# Altium footprint library PCBLIB.PcbLib: 557 footprints (part 32 of 36)
Each footprint in its own frame and in the unit in brackets; x right, y up, seen from the top. Pads: shape width x height; smd on the part's side, far side on the other; paste and mask are expansions set on the pad; w line width, h text height; cw(c..) or ccw(c..) is an arc to the next point about the centre after c.
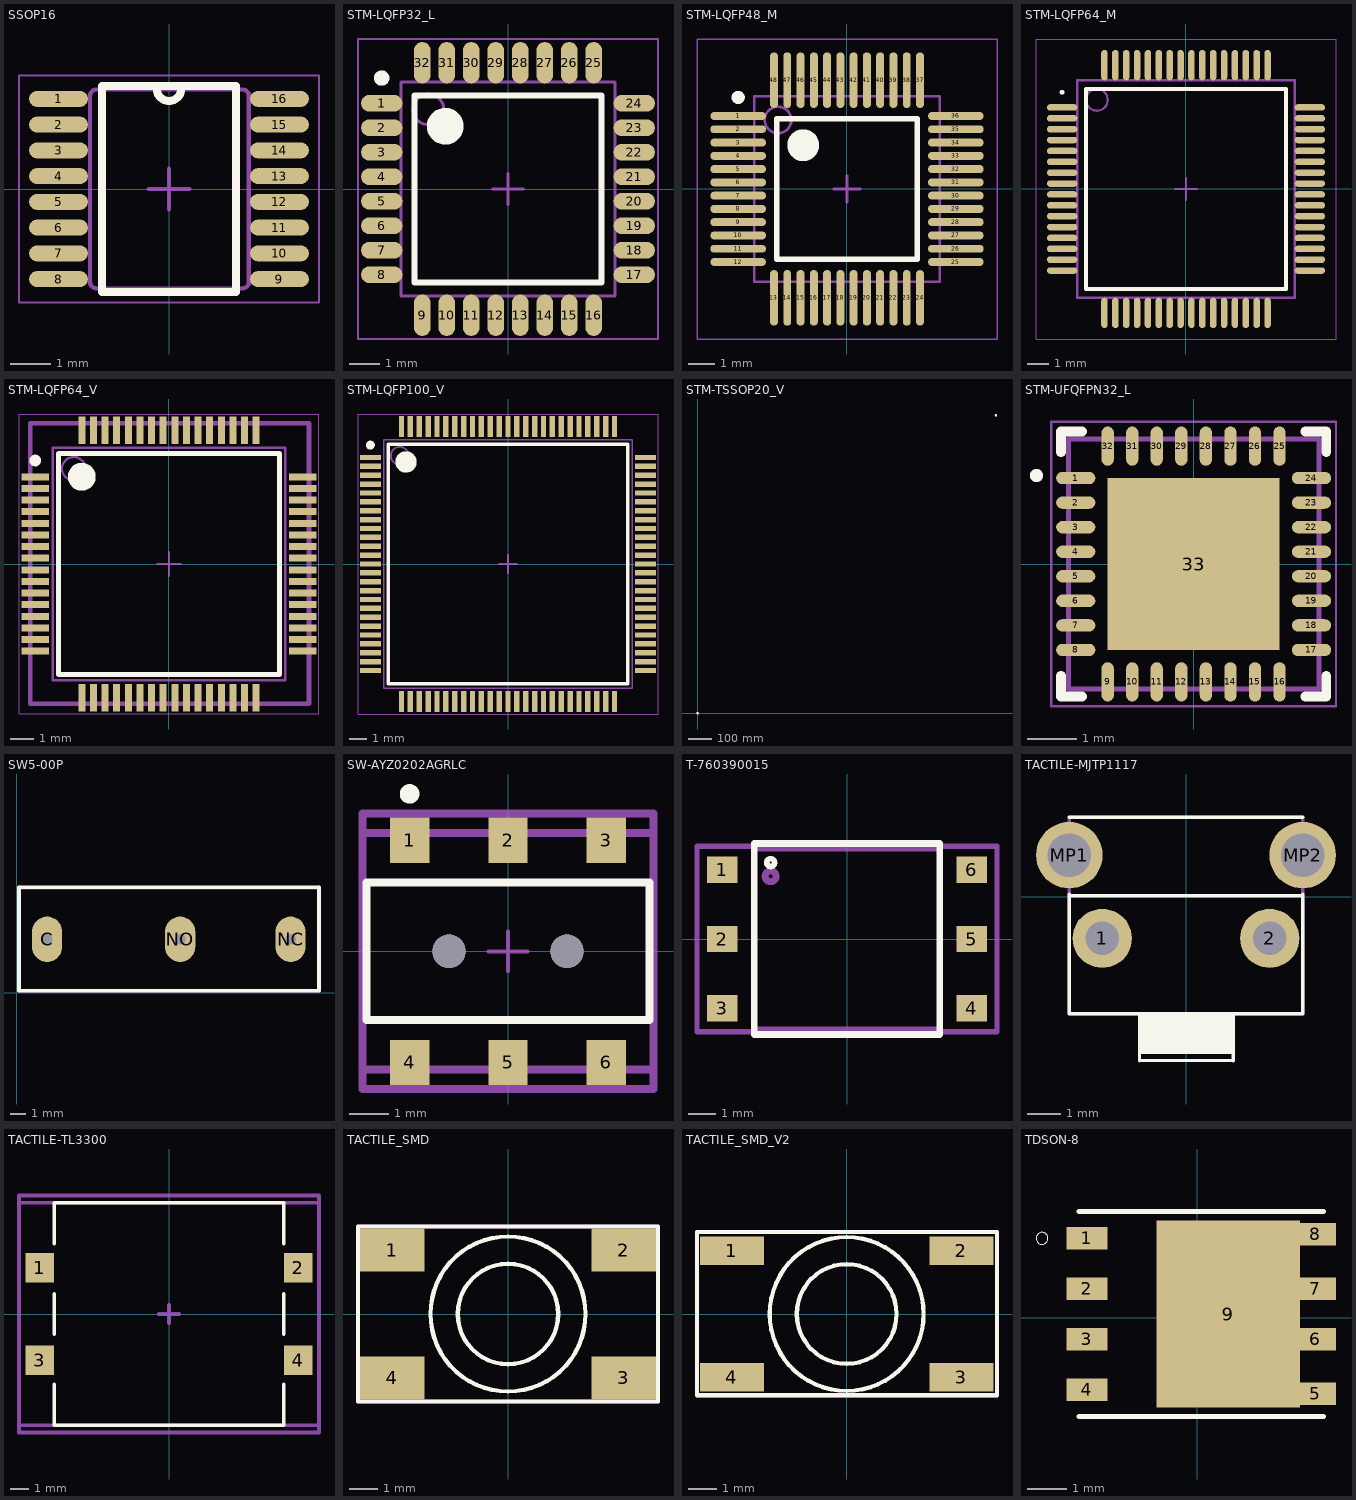
[diagram p31: the footprints below, top view; thin cyan lines are the x and y axes]

## SSOP16 [mm]
height 1.25
pads (16):
  oval 1.45x0.4 smd paste+0 mask+0.05: 1(-2.725,2.222) 2(-2.725,1.587) 3(-2.725,0.953) 4(-2.725,0.318) 5(-2.725,-0.318) 6(-2.725,-0.953) 7(-2.725,-1.587) 8(-2.725,-2.222) 9(2.725,-2.222) 10(2.725,-1.587) 11(2.725,-0.953) 12(2.725,-0.318) 13(2.725,0.318) 14(2.725,0.953) 15(2.725,1.587) 16(2.725,2.222)
Top Overlay:
  lines w0.2: -0.305,2.476 ccw(c0,2.476) 0.305,2.476 ; -1.651,-2.54 1.651,-2.54 1.651,2.54 -1.651,2.54 -1.651,-2.54
Mechanical 15:
  lines w0.05: -3.7,-2.8 3.7,-2.8 3.7,2.8 -3.7,2.8 -3.7,-2.8
  lines w0.1: -0.5,0 0.5,0 ; 0,-0.5 0,0.5
ASM Top:
  lines w0.1: -1.944,-2.349 -1.944,-2.095 ; -1.944,-1.714 -1.944,-1.46 ; -1.944,-1.079 -1.944,-0.825 ; -1.944,-0.444 -1.944,-0.19 ; -1.944,0.191 -1.944,0.445 ; -1.944,0.826 -1.944,1.08 ; -1.944,1.461 -1.944,1.715 ; -1.944,2.096 -1.944,2.35 ; 1.967,-2.349 1.967,-2.095 ; 1.967,-1.714 1.967,-1.46 ; 1.967,-1.079 1.967,-0.825 ; 1.967,-0.444 1.967,-0.19 ; 1.967,0.191 1.967,0.445 ; 1.967,0.826 1.967,1.08 ; 1.967,1.461 1.967,1.715 ; 1.967,2.096 1.967,2.35 ; -1.944,-2.3 ccw(c-1.795,-2.301) -1.794,-2.451 -1.792,-2.451 1.815,-2.451 1.817,-2.451 ccw(c1.818,-2.301) 1.967,-2.3 1.967,-2.298 1.967,2.299 1.967,2.302 ccw(c1.818,2.303) 1.817,2.452 1.815,2.452 -1.792,2.452 -1.794,2.452 ccw(c-1.795,2.303) -1.944,2.302 -1.944,2.299 -1.944,-2.298 -1.944,-2.3
  text ".designator" at -0.6,-0.2 h0.8
3D body "SSOP16.step": height 1.75, standoff 0.01, extent -3.126,-2.5 3.127,2.5

## STM-LQFP32_L [mm] "QFP, 32-Leads, Body 7x7mm, Pitch 0.8mm, IPC High Density"
height 1.6
pads (32):
  oval 1.35x0.55 smd mask+0.05: 1(-4.125,2.8) 2(-4.125,2) 3(-4.125,1.2) 4(-4.125,0.4) 5(-4.125,-0.4) 6(-4.125,-1.2) 7(-4.125,-2) 8(-4.125,-2.8) 17(4.125,-2.8) 18(4.125,-2) 19(4.125,-1.2) 20(4.125,-0.4) 21(4.125,0.4) 22(4.125,1.2) 23(4.125,2) 24(4.125,2.8)
  oval 0.55x1.35 smd mask+0.05: 9(-2.8,-4.125) 10(-2,-4.125) 11(-1.2,-4.125) 12(-0.4,-4.125) 13(0.4,-4.125) 14(1.2,-4.125) 15(2,-4.125) 16(2.8,-4.125) 25(2.8,4.125) 26(2,4.125) 27(1.2,4.125) 28(0.4,4.125) 29(-0.4,4.125) 30(-1.2,4.125) 31(-2,4.125) 32(-2.8,4.125)
Top Overlay:
  circle w0.25: c-4.125,3.625 r0.125
  circle w0.6: c-2.05,2.05 r0.3
  lines w0.2: -3.05,-3.05 -3.05,3.05 3.05,3.05 3.05,-3.05 -3.05,-3.05
Mechanical 15:
  lines w0.05: -4.9,-4.9 -4.9,4.9 4.9,4.9 4.9,-4.9 -4.9,-4.9
  lines w0.1: -0.5,0 0.5,0 ; 0,-0.5 0,0.5
ASM Top:
  circle w0.1: c-2.6,2.599 r0.5
  lines w0.1: -3.5,-3.501 3.5,-3.501 3.5,3.499 -3.5,3.499 -3.5,-3.501
3D body "User Library-LQFP32-2.STEP": height 1.64, standoff 0.01, extent -4.571,-4.572 4.573,4.572

## STM-LQFP48_M [mm] "QFP, 48-Leads, Body 7x7mm, Pitch 0.5mm, IPC Low Density"
height 1.6
pads (48):
  oval 2.1x0.3 smd mask+0.05: 1(-4.1,2.75) 2(-4.1,2.25) 3(-4.1,1.75) 4(-4.1,1.25) 5(-4.1,0.75) 6(-4.1,0.25) 7(-4.1,-0.25) 8(-4.1,-0.75) 9(-4.1,-1.25) 10(-4.1,-1.75) 11(-4.1,-2.25) 12(-4.1,-2.75) 25(4.1,-2.75) 26(4.1,-2.25) 27(4.1,-1.75) 28(4.1,-1.25) 29(4.1,-0.75) 30(4.1,-0.25) 31(4.1,0.25) 32(4.1,0.75) 33(4.1,1.25) 34(4.1,1.75) 35(4.1,2.25) 36(4.1,2.75)
  oval 0.3x2.1 smd mask+0.05: 13(-2.75,-4.1) 14(-2.25,-4.1) 15(-1.75,-4.1) 16(-1.25,-4.1) 17(-0.75,-4.1) 18(-0.25,-4.1) 19(0.25,-4.1) 20(0.75,-4.1) 21(1.25,-4.1) 22(1.75,-4.1) 23(2.25,-4.1) 24(2.75,-4.1) 37(2.75,4.1) 38(2.25,4.1) 39(1.75,4.1) 40(1.25,4.1) 41(0.75,4.1) 42(0.25,4.1) 43(-0.25,4.1) 44(-0.75,4.1) 45(-1.25,4.1) 46(-1.75,4.1) 47(-2.25,4.1) 48(-2.75,4.1)
Top Overlay:
  circle w0.25: c-4.1,3.45 r0.125
  circle w0.6: c-1.65,1.65 r0.3
  lines w0.2: -2.65,-2.65 -2.65,2.65 2.65,2.65 2.65,-2.65 -2.65,-2.65
Mechanical 15:
  lines w0.05: -5.65,-5.65 -5.65,5.65 5.65,5.65 5.65,-5.65 -5.65,-5.65
  lines w0.1: -0.5,0 0.5,0 ; 0,-0.5 0,0.5
ASM Top:
  circle w0.1: c-2.6,2.6 r0.5
  lines w0.1: -3.5,-3.5 3.5,-3.5 3.5,3.5 -3.5,3.5 -3.5,-3.5
3D body "SW3dPS-Quad50M48.STEP": height 1.57, standoff 0.01, extent -4.5,-4.436 4.5,4.564

## STM-LQFP64_M [mm] "QFP, 64-Leads, Body 10x10mm, Pitch 0.5mm, IPC Low Density"
height 1.6
pads (64):
  oval 1.4x0.3 smd: 1(-5.7,3.75) 2(-5.7,3.25) 3(-5.7,2.75) 4(-5.7,2.25) 5(-5.7,1.75) 6(-5.7,1.25) 7(-5.7,0.75) 8(-5.7,0.25) 9(-5.7,-0.25) 10(-5.7,-0.75) 11(-5.7,-1.25) 12(-5.7,-1.75) 13(-5.7,-2.25) 14(-5.7,-2.75) 15(-5.7,-3.25) 16(-5.7,-3.75) 33(5.7,-3.75) 34(5.7,-3.25) 35(5.7,-2.75) 36(5.7,-2.25) 37(5.7,-1.75) 38(5.7,-1.25) 39(5.7,-0.75) 40(5.7,-0.25) 41(5.7,0.25) 42(5.7,0.75) 43(5.7,1.25) 44(5.7,1.75) 45(5.7,2.25) 46(5.7,2.75) 47(5.7,3.25) 48(5.7,3.75)
  oval 0.3x1.4 smd: 17(-3.75,-5.7) 18(-3.25,-5.7) 19(-2.75,-5.7) 20(-2.25,-5.7) 21(-1.75,-5.7) 22(-1.25,-5.7) 23(-0.75,-5.7) 24(-0.25,-5.7) 25(0.25,-5.7) 26(0.75,-5.7) 27(1.25,-5.7) 28(1.75,-5.7) 29(2.25,-5.7) 30(2.75,-5.7) 31(3.25,-5.7) 32(3.75,-5.7) 49(3.75,5.7) 50(3.25,5.7) 51(2.75,5.7) 52(2.25,5.7) 53(1.75,5.7) 54(1.25,5.7) 55(0.75,5.7) 56(0.25,5.7) 57(-0.25,5.7) 58(-0.75,5.7) 59(-1.25,5.7) 60(-1.75,5.7) 61(-2.25,5.7) 62(-2.75,5.7) 63(-3.25,5.7) 64(-3.75,5.7)
Top Overlay:
  circle w0.12: c-5.7,4.45 r0.05
  lines w0.2: -4.6,-4.6 4.6,-4.6 4.6,4.6 -4.6,4.6 -4.6,-4.6
Mechanical 15:
  lines w0.05: -6.9,-6.9 6.9,-6.9 6.9,6.9 -6.9,6.9 -6.9,-6.9
  lines w0.1: -0.5,0 0.5,0 ; 0,-0.5 0,0.5
ASM Top:
  circle w0.1: c-4.1,4.1 r0.5
  lines w0.1: -5,-5 5,-5 5,5 -5,5 -5,-5
  text ".designator" at -1.1,-0.25 h0.8
3D body: height 1.6, standoff 0.05, extent -5,-5 5,5

## STM-LQFP64_V [mm] "Thin QFP, 64-Leads, Body 10x10mm, Pitch 0.5mm, ST Recommended"
height 1.6
pads (64):
  rect 1.2x0.3 smd: 1(-5.75,3.75) 2(-5.75,3.25) 3(-5.75,2.75) 4(-5.75,2.25) 5(-5.75,1.75) 6(-5.75,1.25) 7(-5.75,0.75) 8(-5.75,0.25) 9(-5.75,-0.25) 10(-5.75,-0.75) 11(-5.75,-1.25) 12(-5.75,-1.75) 13(-5.75,-2.25) 14(-5.75,-2.75) 15(-5.75,-3.25) 16(-5.75,-3.75) 33(5.75,-3.75) 34(5.75,-3.25) 35(5.75,-2.75) 36(5.75,-2.25) 37(5.75,-1.75) 38(5.75,-1.25) 39(5.75,-0.75) 40(5.75,-0.25) 41(5.75,0.25) 42(5.75,0.75) 43(5.75,1.25) 44(5.75,1.75) 45(5.75,2.25) 46(5.75,2.75) 47(5.75,3.25) 48(5.75,3.75)
  rect 0.3x1.2 smd: 17(-3.75,-5.75) 18(-3.25,-5.75) 19(-2.75,-5.75) 20(-2.25,-5.75) 21(-1.75,-5.75) 22(-1.25,-5.75) 23(-0.75,-5.75) 24(-0.25,-5.75) 25(0.25,-5.75) 26(0.75,-5.75) 27(1.25,-5.75) 28(1.75,-5.75) 29(2.25,-5.75) 30(2.75,-5.75) 31(3.25,-5.75) 32(3.75,-5.75) 49(3.75,5.75) 50(3.25,5.75) 51(2.75,5.75) 52(2.25,5.75) 53(1.75,5.75) 54(1.25,5.75) 55(0.75,5.75) 56(0.25,5.75) 57(-0.25,5.75) 58(-0.75,5.75) 59(-1.25,5.75) 60(-1.75,5.75) 61(-2.25,5.75) 62(-2.75,5.75) 63(-3.25,5.75) 64(-3.75,5.75)
Top Overlay:
  circle w0.6: c-3.75,3.75 r0.3
  circle w0.25: c-5.75,4.45 r0.125
  lines w0.2: -4.75,-4.75 4.75,-4.75 4.75,4.75 -4.75,4.75 -4.75,-4.75
Mechanical 13:
  circle w0.1: c-4.1,4.1 r0.5
  lines w0.1: -5,-5 5,-5 5,5 -5,5 -5,-5
Mechanical 15:
  lines w0.05: -6.45,-6.45 6.45,-6.45 6.45,6.45 -6.45,6.45 -6.45,-6.45
  lines w0.1: -0.5,0 0.5,0 ; 0,-0.5 0,0.5
ASM Top:
  lines w0.2: -5.969,-6.003 -5.969,6.045 6.02,6.045 6.02,-6.003 -5.969,-6.003
  text ".designator" at 0,0 h0.8
3D body "User Library-STM32F107 -LQFP64 10mm x 10mm.step": height 1.6, standoff 0.01, extent -5.999,-6.003 5.999,5.994

## STM-LQFP100_V [mm] "Thin QFP, 100-Leads, Body 14x14mm, Pitch 0.5mm, ST Recommended"
height 1.6
pads (100):
  rect 1.2x0.3 smd: 1(-7.75,6) 2(-7.75,5.5) 3(-7.75,5) 4(-7.75,4.5) 5(-7.75,4) 6(-7.75,3.5) 7(-7.75,3) 8(-7.75,2.5) 9(-7.75,2) 10(-7.75,1.5) 11(-7.75,1) 12(-7.75,0.5) 13(-7.75,0) 14(-7.75,-0.5) 15(-7.75,-1) 16(-7.75,-1.5) 17(-7.75,-2) 18(-7.75,-2.5) 19(-7.75,-3) 20(-7.75,-3.5) 21(-7.75,-4) 22(-7.75,-4.5) 23(-7.75,-5) 24(-7.75,-5.5) 25(-7.75,-6) 51(7.75,-6) 52(7.75,-5.5) 53(7.75,-5) 54(7.75,-4.5) 55(7.75,-4) 56(7.75,-3.5) 57(7.75,-3) 58(7.75,-2.5) 59(7.75,-2) 60(7.75,-1.5) 61(7.75,-1) 62(7.75,-0.5) 63(7.75,0) 64(7.75,0.5) 65(7.75,1) 66(7.75,1.5) 67(7.75,2) 68(7.75,2.5) 69(7.75,3) 70(7.75,3.5) 71(7.75,4) 72(7.75,4.5) 73(7.75,5) 74(7.75,5.5) 75(7.75,6)
  rect 0.3x1.2 smd: 26(-6,-7.75) 27(-5.5,-7.75) 28(-5,-7.75) 29(-4.5,-7.75) 30(-4,-7.75) 31(-3.5,-7.75) 32(-3,-7.75) 33(-2.5,-7.75) 34(-2,-7.75) 35(-1.5,-7.75) 36(-1,-7.75) 37(-0.5,-7.75) 38(0,-7.75) 39(0.5,-7.75) 40(1,-7.75) 41(1.5,-7.75) 42(2,-7.75) 43(2.5,-7.75) 44(3,-7.75) 45(3.5,-7.75) 46(4,-7.75) 47(4.5,-7.75) 48(5,-7.75) 49(5.5,-7.75) 50(6,-7.75) 76(6,7.75) 77(5.5,7.75) 78(5,7.75) 79(4.5,7.75) 80(4,7.75) 81(3.5,7.75) 82(3,7.75) 83(2.5,7.75) 84(2,7.75) 85(1.5,7.75) 86(1,7.75) 87(0.5,7.75) 88(0,7.75) 89(-0.5,7.75) 90(-1,7.75) 91(-1.5,7.75) 92(-2,7.75) 93(-2.5,7.75) 94(-3,7.75) 95(-3.5,7.75) 96(-4,7.75) 97(-4.5,7.75) 98(-5,7.75) 99(-5.5,7.75) 100(-6,7.75)
Top Overlay:
  circle w0.6: c-5.75,5.75 r0.3
  circle w0.25: c-7.75,6.7 r0.125
  lines w0.2: -6.75,-6.75 6.75,-6.75 6.75,6.75 -6.75,6.75 -6.75,-6.75
Mechanical 15:
  lines w0.05: -8.45,-8.45 8.45,-8.45 8.45,8.45 -8.45,8.45 -8.45,-8.45
  lines w0.1: -0.5,0 0.5,0 ; 0,-0.5 0,0.5
ASM Top:
  circle w0.1: c-6.1,6.1 r0.5
  lines w0.1: -7,-7 -7,7 7,7 7,-7 -7,-7
  text ".designator" at -0.8,0 h0.8
3D body "User Library-LQFP100.step": height 1.6, standoff 0, extent -8,-8 8,8

## STM-TSSOP20_V [mm] "SOP, 20-Leads, Body 6.6x4.5mm, Pitch 0.65mm"
height 1.2
pads (40):
  oval 1.35x0.4 smd: 1(-2.875,2.925) 1(1267.125,1272.925) 2(-2.875,2.275) 2(1267.125,1272.275) 3(-2.875,1.625) 3(1267.125,1271.625) 4(-2.875,0.975) 4(1267.125,1270.975) 5(-2.875,0.325) 5(1267.125,1270.325) 6(-2.875,-0.325) 6(1267.125,1269.675) 7(-2.875,-0.975) 7(1267.125,1269.025) 8(-2.875,-1.625) 8(1267.125,1268.375) 9(-2.875,-2.275) 9(1267.125,1267.725) 10(-2.875,-2.925) 10(1267.125,1267.075) 11(2.875,-2.925) 11(1272.875,1267.075) 12(2.875,-2.275) 12(1272.875,1267.725) 13(2.875,-1.625) 13(1272.875,1268.375) 14(2.875,-0.975) 14(1272.875,1269.025) 15(2.875,-0.325) 15(1272.875,1269.675) 16(2.875,0.325) 16(1272.875,1270.325) 17(2.875,0.975) 17(1272.875,1270.975) 18(2.875,1.625) 18(1272.875,1271.625) 19(2.875,2.275) 19(1272.875,1272.275) 20(2.875,2.925) 20(1272.875,1272.925)
Top Overlay:
  circle w0.25: c1267.125,1273.675 r0.125
  circle w0.2: c-2.875,3.675 r0.1
  lines w0.2: -1.8,-3.3 1.8,-3.3 1.8,3.3 -1.8,3.3 -1.8,-3.3 ; 1268.2,1266.7 1268.2,1273.3 1271.8,1273.3 1271.8,1266.7 1268.2,1266.7
Mechanical 15:
  lines w0.05: -3.65,-3.4 3.65,-3.4 3.65,3.4 -3.65,3.4 -3.65,-3.4 ; 1266.35,1266.6 1266.35,1273.4 1273.65,1273.4 1273.65,1266.6 1266.35,1266.6
  lines w0.1: -0.5,0 0.5,0 ; 0,-0.5 0,0.5 ; 1269.5,1270 1270.5,1270 ; 1270,1269.5 1270,1270.5
ASM Top:
  circle w0.1: c-1.35,2.4 r0.5
  lines w0.1: -2.25,-3.3 -2.25,3.3 2.25,3.3 2.25,-3.3 -2.25,-3.3
  text ".designator" at -1.041,-0.184 h0.8
3D body: height 1.2, standoff 0.05, extent 1267.75,1266.7 1272.25,1273.3
3D body: height 1.2, standoff 0.05, extent -2.25,-3.3 2.25,3.3

## STM-UFQFPN32_L [mm] "QFN, 32-Leads, Body 5.1x5.1mm, Pitch 0.5mm, Thermal Pad 3.5x3.5mm, IPC High Density"
height 0.6
pads (33):
  oval 0.8x0.25 smd mask+0.05: 1(-2.4,1.75) 2(-2.4,1.25) 3(-2.4,0.75) 4(-2.4,0.25) 5(-2.4,-0.25) 6(-2.4,-0.75) 7(-2.4,-1.25) 8(-2.4,-1.75) 17(2.4,-1.75) 18(2.4,-1.25) 19(2.4,-0.75) 20(2.4,-0.25) 21(2.4,0.25) 22(2.4,0.75) 23(2.4,1.25) 24(2.4,1.75)
  oval 0.25x0.8 smd mask+0.05: 9(-1.75,-2.4) 10(-1.25,-2.4) 11(-0.75,-2.4) 12(-0.25,-2.4) 13(0.25,-2.4) 14(0.75,-2.4) 15(1.25,-2.4) 16(1.75,-2.4) 25(1.75,2.4) 26(1.25,2.4) 27(0.75,2.4) 28(0.25,2.4) 29(-0.25,2.4) 30(-0.75,2.4) 31(-1.25,2.4) 32(-1.75,2.4)
  rect 3.5x3.5 smd paste-5 mask+0.05: 33(0,0)
Top Overlay:
  circle w0.25: c-3.2,1.8 r0.01
  lines w0.2: -2.7,-2.275 -2.7,-2.7 -2.275,-2.7 ; -2.7,2.275 -2.7,2.7 -2.275,2.7 ; 2.275,-2.7 2.7,-2.7 2.7,-2.275 ; 2.275,2.7 2.7,2.7 2.7,2.275
Top Paste:
  rectangle: -0.8,0.1 -0.3,1
  region: 0.8,1 0.3,1 0.3,0.1 0.8,0.1
  rectangle: -0.8,-1 -0.3,-0.1
  region: 0.8,-0.1 0.3,-0.1 0.3,-1 0.8,-1
Mechanical 15:
  lines w0.05: -2.9,-2.9 -2.9,2.9 2.9,2.9 2.9,-2.9 -2.9,-2.9
  lines w0.1: -0.5,0 0.5,0 ; 0,-0.5 0,0.5
ASM Top:
  lines w0.1: -2.55,-2.55 -2.55,2.55 2.55,2.55 2.55,-2.55 -2.55,-2.55
  text ".designator" at -0.5,-0.2 h0.8
3D body: height 0.6, standoff 0, extent -2.55,-2.55 2.55,2.55

## SW5-00P [mm] "SW5-00P-150-C5  SWITCH SNAP ACTION SPDT 5A 250V"
height 10.5
pads (3):
  oval 2x3 hole 0.7 square: C(2,3.52) NC(18.1,3.52) NO(10.8,3.52)
Top Overlay:
  lines w0.254: 7.15,6.96 13.05,6.96 ; 10.25,6.96 0.14,6.96 0.14,0.12 10.25,0.12 10.95,0.12 19.98,0.12 19.98,6.96 10.95,6.96
ASM Top:
  lines w0.254: 0.14,0.12 0.14,6.96 ; 0.14,0.145 19.94,0.12 ; 0.14,6.94 19.94,6.92 ; 19.98,0.12 19.98,6.96
  text ".designator" at 5.5,3.02 h0.8
3D body "switch_SW5-00P-150-C5.stp": height 12.51, standoff -3.34, extent 0.15,0.16 19.95,6.96

## SW-AYZ0202AGRLC [mm]
pads (8):
  rect 1x1.15 smd paste+0 mask+0: 1(-2.5,2.825) 2(0,2.825) 3(2.5,2.825) 4(-2.5,-2.825) 5(0,-2.825) 6(2.5,-2.825)
  round 0.85 hole 0.85 unplated paste-1000 mask+0: ""(-1.5,0) ""(1.5,0)
Top Overlay:
  circle w0.25: c-2.5,4 r0.125
  lines w0.2: -3.6,-1.75 3.6,-1.75 3.6,1.75 -3.6,1.75 -3.6,-1.75
Mechanical 15:
  lines w0.2: -3.7,-3.5 3.7,-3.5 3.7,3.5 -3.7,3.5 -3.7,-3.5
Mechanical 16:
  lines w0.1: -0.5,0 0.5,0 ; 0,-0.5 0,0.5
ASM Top:
  lines w0.2: -3.7,-3 3.7,-3 3.7,3.004 -3.7,3.004 -3.7,-2.9 -3.7,-3
  text ".designator" at 0,0.188 h0.8
3D body "Switch_C&K_Components_AYZ0202AGRLC_eec.STEP": height 2.5, standoff -0.5, extent -3.6,-3 3.6,3

## T-760390015 [mm] "760390015"
height 4.72
pads (6):
  rect 1.12x0.96 smd paste+0 mask+0.05: 1(-4.57,2.54) 2(-4.57,0) 3(-4.57,-2.54) 4(4.57,-2.54) 5(4.57,0) 6(4.57,2.54)
Top Overlay:
  circle w0.2: c-2.8,2.8 r0.143
  lines w0.254: -3.4,-3.5 -3.4,3.5 3.4,3.5 3.4,-3.5 -3.4,-3.5
Mechanical 15:
  lines w0.2: -5.5,-3.4 5.5,-3.4 5.5,3.4 -5.5,3.4 -5.5,-3.4
ASM Top:
  circle w0.254: c-2.8,2.3 r0.2
  lines w0.2: -3.4,-3.3 -3.4,3.3 3.4,3.3 3.4,-3.3 -3.4,-3.3
  text ".designator" at -2.5,-0.4 h0.8
3D body "760390015_Download_STP_250-1109_rev1.STEP": height 4.08, standoff 0.02, extent -4.98,-3.3 4.98,3.18

## TACTILE-MJTP1117 [mm]
pads (4):
  round 1.778 hole 1: 1(-2.515,-1.245) 2(2.515,-1.245)
  round 2 hole 1.3: MP1(-3.505,1.255) MP2(3.505,1.255)
Top Overlay:
  region: -1.397,-3.475 1.422,-3.475 1.422,-4.716 -1.397,-4.716
  lines w0.1: -3.505,0.039 3.505,0.039 ; -1.397,-4.915 1.422,-4.915
  lines w0.102: -3.505,0.075 -3.505,-3.505 3.505,-3.505 3.505,0.075 ; -3.505,2.388 3.505,2.388 ; -1.397,-4.915 -1.397,-3.505 1.422,-3.505 1.422,-4.915
ASM Top:
  lines w0.1: -3.505,-3.505 3.505,-3.505
  lines w0.102: -3.505,-3.505 -3.505,2.388 3.505,2.388 3.505,-3.505
  text ".designator" at -1.778,0 h0.8
3D body "TACTILE RIGHT ANGLE.STEP": height 4.31, standoff -3.59, extent -4.205,-4.961 4.205,2.175

## TACTILE-TL3300 [mm]
height 7.3
pads (4):
  rect 1.55x1.6 smd: 1(-6.975,2.5) 2(6.975,2.5) 3(-6.975,-2.5) 4(6.975,-2.5)
Top Overlay:
  lines w0.2: -6.2,-3.8 -6.2,-6 6.2,-6 6.2,-3.8 ; -6.2,-1.1 -6.2,1.1 ; -6.2,3.8 -6.2,6 6.2,6 6.2,3.8 ; 6.2,-1.1 6.2,1.1
Mechanical 15:
  lines w0.2: -0.55,0 0.55,0 ; 0,-0.5 0,0.5 0,0 ; -8.1,-6.4 8.1,-6.4 8.1,6.4 -8.1,6.4 -8.1,1.5 -8.1,-6.4
ASM Top:
  lines w0.2: -8.1,-6 -8.1,6 8.1,6 8.1,-6 -8.1,-6
  text ".designator" at -0.5,-0.4 h0.8
3D body "TL3300AFxxxQ.stp": height 7.6, standoff 0, extent -7.5,-6 7.5,6

## TACTILE_SMD [mil]
pads (4):
  rect 90x60 smd mask+1.97: 1(-161,89) 2(161,89) 3(161,-89) 4(-161,-89)
Top Overlay:
  circle w6: c0,0 r70
  circle w6: c0,0 r108
  lines w6: -209,-122 209,-122 209,122 -209,122 -209,-122
ASM Top:
  lines w6: -209,-122 -209,122 209,122 209,-122 -209,-122
  text ".designator" at -51,-21 h31.5
3D body "tactile smd heigh 5mm.STEP": height 196.85, standoff 0, extent -177.33,-118 177,118.22

## TACTILE_SMD_V2 [mil]
pads (4):
  rect 90x40 smd mask+1.97: 1(-161,89) 2(161,89) 3(161,-89) 4(-161,-89)
Top Overlay:
  circle w6: c0,0 r70
  circle w6: c0,0 r108
  lines w6: -210,-114 211,-114 211,115 -210,115 -210,-114
ASM Top:
  lines w6: -210,-114 -210,115 211,115 211,-114 -210,-114
  text ".designator" at -51,-21 h31.5
3D body "tactile smd heigh 5mm.STEP": height 196.85, standoff 0, extent -177.33,-118 177,118.22

## TDSON-8 [mm]
pads (9):
  rect 1.03x0.57 smd: 1(-2.77,2.005) 2(-2.77,0.735) 3(-2.77,-0.535) 4(-2.77,-1.805) 5(2.97,-1.9) 6(2.97,-0.535) 7(2.97,0.735) 8(2.97,2.1)
  rect 3.6x4.7 smd: 9(0.775,0.1)
Top Overlay:
  circle w0: c-3.9,2 r0.15
  lines w0.127: -2.975,-2.475 3.175,-2.475 ; -2.975,2.675 3.175,2.675
ASM Top:
  circle w0: c-3.901,2 r0.15
  lines w0.127: -2.976,-2.475 3.174,-2.475 ; -2.976,2.675 3.174,2.675
  text ".designator" at -0.5,0 h0.8
3D body "User Library-TDSON-8 (INFIN).STEP": height 1.1, standoff -0.01, extent -3.075,-2.695 3.275,2.895